# Altium footprint library PcbLib1.PcbLib: 45 footprints (part 3 of 3)
Each footprint in its own frame and in the unit in brackets; x right, y up, seen from the top. Pads: shape width x height; smd on the part's side, far side on the other; paste and mask are expansions set on the pad; w line width, h text height; cw(c..) or ccw(c..) is an arc to the next point about the centre after c.
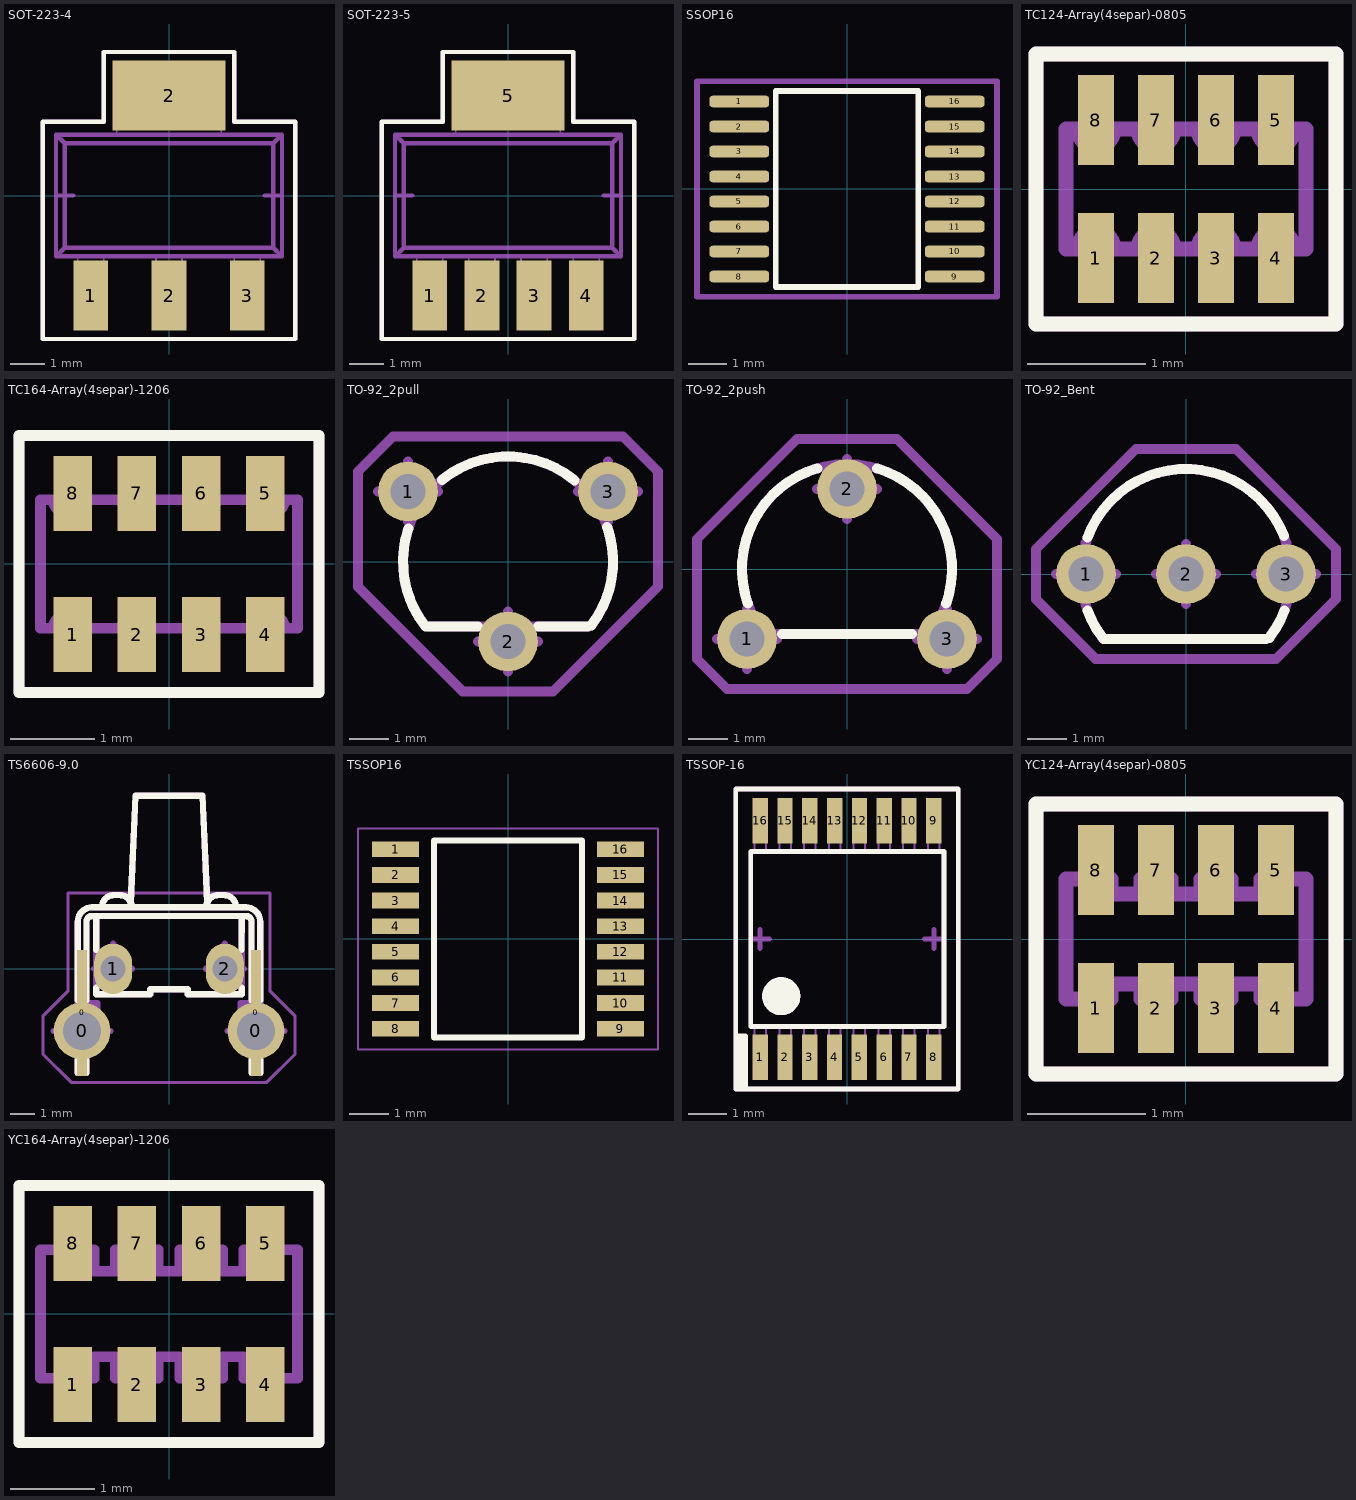
[diagram p2: the footprints below, top view; thin cyan lines are the x and y axes]

## SOT-223-4 [mil]
pads (4):
  rect 40x80 smd: 1(-90,-115) 2(0,-115) 3(90,-115)
  rect 130x80 smd: 2(0,115)
Top Overlay:
  lines w5: -145,-165 145,-165 145,85 75,85 75,165 -75,165 -75,85 -145,85 -145,-165
Bottom 3D Body:
  lines w2: -105,-105 -75,-105 ; -105,-90 -75,-90 ; -105,-70 -105,-140 -75,-140 -75,-70 ; -60,70 -60,140 60,140 60,70 ; -60,90 60,90 ; -60,105 60,105 ; -15,-105 15,-105 ; -15,-90 15,-90 ; -15,-70 -15,-140 15,-140 15,-70 ; 75,-105 105,-105 ; 75,-90 105,-90 ; 75,-70 75,-140 105,-140 105,-70
  lines w5: -130,-70 130,-70 ; -130,-70 -130,70 ; -130,-70 -120,-60 ; -130,70 130,70 ; -130,70 -120,60 ; -120,-60 -120,60 ; -120,-60 120,-60 ; -120,60 120,60 ; 120,-60 130,-70 ; 120,-60 120,60 ; 120,60 130,70 ; 130,-70 130,70
  text "'.Designator'" at -75,-15 h60
Mechanical 11:
  lines w5: -130,0 -110,0 ; -120,-10 -120,10 ; 110,0 130,0 ; 120,-10 120,10
Mechanical 15:
  lines w5: -145,-165 -145,85 -75,85 -75,165 75,165 75,85 145,85 145,-165 -145,-165
3D body "SOT-223-4.STEP": height 66.93, standoff -0.08, extent -129.92,-141.65 129.92,141.65

## SOT-223-5 [mil]
pads (5):
  rect 40x80 smd: 1(-90,-115) 2(-30,-115) 3(30,-115) 4(90,-115)
  rect 130x80 smd: 5(0,115)
Top Overlay:
  lines w5: -145,-165 145,-165 145,85 75,85 75,165 -75,165 -75,85 -145,85 -145,-165
Bottom 3D Body:
  lines w2: -105,-105 -75,-105 ; -105,-90 -75,-90 ; -105,-70 -105,-140 -75,-140 -75,-70 ; -60,70 -60,140 60,140 60,70 ; -60,90 60,90 ; -60,105 60,105 ; -45,-105 -15,-105 ; -45,-90 -15,-90 ; -45,-70 -45,-140 -15,-140 -15,-70 ; 15,-105 45,-105 ; 15,-90 45,-90 ; 15,-70 15,-140 45,-140 45,-70 ; 75,-105 105,-105 ; 75,-90 105,-90 ; 75,-70 75,-140 105,-140 105,-70
  lines w5: -130,-70 -120,-60 ; -130,-70 -130,70 ; -130,-70 130,-70 ; -130,70 -120,60 ; -130,70 130,70 ; -120,-60 120,-60 ; -120,-60 -120,60 ; -120,60 120,60 ; 120,-60 120,60 ; 120,-60 130,-70 ; 120,60 130,70 ; 130,-70 130,70
  text "'.Designator'" at -75,-15 h60
Mechanical 11:
  lines w5: -130,0 -110,0 ; -120,-10 -120,10 ; 110,0 130,0 ; 120,-10 120,10
Mechanical 15:
  lines w5: -145,-165 -145,85 -75,85 -75,165 75,165 75,85 145,85 145,-165 -145,-165
3D body "SOT-223-5.STEP": height 66.93, standoff 0, extent -129.92,-141.73 129.92,141.73

## SSOP16 [mm]
height 1.2
pads (16):
  rrect50% 1.55x0.3 smd: 1(-2.8,2.275) 2(-2.8,1.625) 3(-2.8,0.975) 4(-2.8,0.325) 5(-2.8,-0.325) 6(-2.8,-0.975) 7(-2.8,-1.625) 8(-2.8,-2.275) 9(2.8,-2.275) 10(2.8,-1.625) 11(2.8,-0.975) 12(2.8,-0.325) 13(2.8,0.325) 14(2.8,0.975) 15(2.8,1.625) 16(2.8,2.275)
Top Overlay:
  lines w0.15: -1.85,-2.55 1.85,-2.55 1.85,2.55 -1.85,2.55 -1.85,-2.55
  text "." at -2.6,2.9 h0.1
Top Courtyard:
  lines w0.15: -3.9,-2.8 3.9,-2.8 3.9,2.8 -3.9,2.8 -3.9,-2.8

## TC124-Array(4separ)-0805 [mil]
pads (8):
  rect 12x30 smd: 1(-30,-23) 2(-10,-23) 3(10,-23) 4(30,-23) 5(30,23) 6(10,23) 7(-10,23) 8(-30,23)
Top Overlay:
  lines w5: -50,-45 50,-45 50,45 -50,45 -50,-45
Bottom 3D Body:
  lines w5: -40,-20 -36,-20 cw(c-30,-20) -24,-20 -16,-20 cw(c-10,-20) -4,-20 4,-20 cw(c10,-20) 16,-20 24,-20 cw(c30,-20) 36,-20 40,-20 40,20 36,20 cw(c30,20) 24,20 16,20 cw(c10,20) 4,20 -4,20 cw(c-10,20) -16,20 -24,20 cw(c-30,20) -36,20 -40,20 -40,-20
  text "'.Designator'" at -40,-10 h30
Mechanical 15:
  lines w5: -50,-45 50,-45 50,45 -50,45 -50,-45
3D body "TC124-0805-4sep.STEP": height 15.79, standoff 0, extent -39.37,-19.68 39.37,19.69

## TC164-Array(4separ)-1206 [mil]
pads (8):
  rect 18x35 smd: 1(-45,-33) 2(-15,-33) 3(15,-33) 4(45,-33) 5(45,33) 6(15,33) 7(-15,33) 8(-45,33)
Top Overlay:
  lines w5: -70,-60 -70,60 70,60 70,-60 -70,-60
Bottom 3D Body:
  lines w5: -60,-30 -54,-30 cw(c-48,-30) -42,-30 -22,-30 cw(c-16,-30) -10,-30 10,-30 cw(c16,-30) 22,-30 42,-30 cw(c48,-30) 54,-30 60,-30 60,30 54,30 cw(c48,30) 42,30 22,30 cw(c16,30) 10,30 -10,30 cw(c-16,30) -22,30 -42,30 cw(c-48,30) -54,30 -60,30 -60,-30
  text "'.Designator'" at -60,-10 h40
Mechanical 15:
  lines w5: -70,-60 70,-60 70,60 -70,60 -70,-60
3D body "TC164-1206-4sep.STEP": height 23.66, standoff 0, extent -62.99,-31.49 63,31.5

## TO-92_2pull [mil]
pads (3):
  round 60 hole 35: 1(-100,70) 2(0,-80) 3(100,70)
Top Overlay:
  lines w10: -99.61,33.2 ccw(c0,0) -82.56,-64.87 ; -80,-65 -30,-65 ; -66.21,81.49 cw(c0,0) 66.55,81.22 ; 30,-65 80,-65 ; 83.41,-63.78 ccw(c0,0) 99.11,34.69
Bottom 3D Body:
  lines w10: -83.41,-63.78 cw(c0,0) 83.41,-63.78 ; -80,-65 80,-65
  text "'.Designator'" at -90,-15 h60
Mechanical 15:
  lines w10: -150,-25.31 -150,90 -115,125 115,125 150,90 150,-25 45,-130 -45.31,-130 -150,-25.31
Mechanical 25:
  lines w10: -130,70 -70,70 ; -100,40 -100,100 ; -30,-80 30,-80 ; 0,-110 0,-50 ; 70,70 130,70 ; 100,40 100,100
Mechanical 26:
  lines w10: -130,70 -70,70 ; -100,40 -100,100 ; -30,-80 30,-80 ; 0,-110 0,-50 ; 70,70 130,70 ; 100,40 100,100
3D body "TO-92_2pull.STEP": height 389.76, standoff -98.43, extent -110.04,-90.16 110.04,85.43

## TO-92_2push [mil]
pads (3):
  round 60 hole 35: 1(-100,-70) 2(0,80) 3(100,-70)
Top Overlay:
  lines w10: -99.1,-34.69 cw(c0,0) -29.63,100.74 ; -65,-65 65,-65 ; 30.17,100.57 cw(c0,0) 99.1,-34.69
Bottom 3D Body:
  lines w10: -83.41,-63.78 cw(c0,0) 83.41,-63.78 ; -80,-65 80,-65
  text "'.Designator'" at -90,-15 h60
Mechanical 15:
  lines w10: -150,-90 -150,30 -50,130 50,130 150,30 150,-90 120,-120 -120,-120 -150,-90
Mechanical 25:
  lines w10: -130,-70 -70,-70 ; -100,-100 -100,-40 ; -30,80 30,80 ; 0,50 0,110 ; 70,-70 130,-70 ; 100,-100 100,-40
Mechanical 26:
  lines w10: -130,-70 -70,-70 ; -100,-100 -100,-40 ; -30,80 30,80 ; 0,50 0,110 ; 70,-70 130,-70 ; 100,-100 100,-40
3D body "TO-92_2push.STEP": height 389.76, standoff -98.43, extent -110.04,-78.75 110.03,90.15

## TO-92_Bent [mil]
pads (3):
  round 60 hole 35: 1(-100,0) 2(0,0) 3(100,0)
Top Overlay:
  lines w10: -98.53,-36.3 ccw(c0,0) -82.56,-64.87 ; -98.53,36.3 cw(c0,0) 97.86,38.06 ; -80,-65 80,-65 ; 83.41,-63.78 ccw(c0,0) 98.53,-36.3
Bottom 3D Body:
  lines w10: -83.41,-63.78 cw(c0,0) 83.41,-63.78 ; -80,-65 80,-65
  text "'.Designator'" at -70,45 h60
Mechanical 15:
  lines w10: -150,-25.31 -150,25 -50,125 50,125 150,25 150,-25 90,-85 -90.31,-85 -150,-25.31
Mechanical 25:
  lines w10: -130,0 -70,0 ; -100,-30 -100,30 ; -30,0 30,0 ; 0,-30 0,30 ; 70,0 130,0 ; 100,-30 100,30
Mechanical 26:
  lines w10: -130,0 -70,0 ; -100,-30 -100,30 ; -30,0 30,0 ; 0,-30 0,30 ; 70,0 130,0 ; 100,-30 100,30
3D body "TO-92_Bent.STEP": height 389.76, standoff -98.43, extent -110.3,-69.3 110.03,85.43

## TS6606-9.0 [mil]
pads (6):
  round 90 hole 60: 0(-137.8,-98.43) 0(137.8,-98.43)
  rect 16x200 smd: 0(-137.8,-70) 0(137.8,-70)
  oval 60x80 hole 40: 1(-88.58,0) 2(88.58,0)
Top Overlay:
  lines w10: -144.69,-145 -144.69,-165 -130.91,-165 -130.91,-145 ; -144.69,-50 -144.69,74.8 cw(c-122.05,74.8) -122.05,97.44 122.05,97.44 cw(c122.05,74.8) 144.69,74.8 144.69,-50 ; -130.91,-50 -130.91,74.8 cw(c-122.05,74.8) -122.05,83.66 122.05,83.66 cw(c122.05,74.8) 130.91,74.8 130.91,-50 ; -115.16,-30 -115.16,-40.35 -29.53,-40.35 -29.53,-32.48 29.53,-32.48 29.53,-40.35 115.16,-40.35 115.16,-30 ; -115.16,30 -115.16,83.66 ; -106.3,97.44 cw(c-86.61,97.44) -86.61,117.13 -78.74,117.13 cw(c-78.74,97.44) -59.06,97.44 ; -60.49,104.82 -53.14,274.61 53.16,274.61 60.49,104.82 ; 59.06,97.44 cw(c78.74,97.44) 78.74,117.13 86.61,117.13 cw(c86.61,97.44) 106.3,97.44 ; 115,30 115.16,83.66 ; 130.91,-145 130.91,-165 144.69,-165 144.69,-145
Bottom 3D Body:
  lines w5: -162.41,-116.14 -162.41,-80.71 ; -145.77,-116.14 -166.39,-116.14 -166.39,-80.71 -144.69,-80.71 ; 144.69,-80.71 166.39,-80.71 166.39,-116.14 145.77,-116.14 ; 162.41,-116.14 162.41,-80.71 ; -101.38,-3.94 -101.38,3.94 -75.79,3.94 -75.79,-3.94 -101.38,-3.94 ; 75.79,-3.94 75.79,3.94 101.38,3.94 101.38,-3.94 75.79,-3.94
  lines w10: -144.69,-115.79 -130.91,-115.79 ; -144.69,-108.21 -130.91,-108.21 ; -130.91,-103.54 cw(c-113.98,-103.54) -122.44,-88.88 ccw(c-130.91,-74.22) -113.98,-74.22 -113.98,-54.13 -129.43,-54.13 ; -115.16,83.66 -115.16,-40.35 -29.53,-40.35 -29.53,-32.48 29.53,-32.48 29.53,-40.35 115.16,-40.35 115.16,83.66 ; -106.3,97.44 cw(c-86.61,97.44) -86.61,117.13 -78.74,117.13 cw(c-78.74,97.44) -59.06,97.44 ; -60.49,104.82 -53.14,274.61 53.16,274.61 60.49,104.82 ; 59.06,97.44 cw(c78.74,97.44) 78.74,117.13 86.61,117.13 cw(c86.61,97.44) 106.3,97.44 ; 129.43,-54.13 113.98,-54.13 113.98,-74.22 ccw(c130.91,-74.22) 122.44,-88.88 cw(c113.98,-103.54) 130.91,-103.54 ; 130.91,-115.79 144.69,-115.79 ; 130.91,-108.21 144.69,-108.21 ; -144.69,-165 -130.91,-165 -130.91,74.8 cw(c-122.05,74.8) -122.05,83.66 122.05,83.66 cw(c122.05,74.8) 130.91,74.8 130.91,-165 144.69,-165 144.69,74.8 ccw(c122.05,74.8) 122.05,97.44 -122.05,97.44 ccw(c-122.05,74.8) -144.69,74.8 -144.69,-165
  text "'.Designator'" at -86.61,-116.14 h60
Mechanical 15:
  lines w5: -200,-135 -200,-75 -160,-35 -160,120 160,120 160,-35 200,-75 200,-135 155,-180 -155,-180 -200,-135
Mechanical 25:
  lines w10: -182.8,-98.43 -92.8,-98.43 ; -137.8,-143.43 -137.8,-53.43 ; -118.58,0 -58.58,0 ; -88.58,-40 -88.58,40 ; 58.58,0 118.58,0 ; 88.58,-40 88.58,40 ; 92.8,-98.43 182.8,-98.43 ; 137.8,-143.43 137.8,-53.43
Mechanical 26:
  lines w10: -182.8,-98.43 -92.8,-98.43 ; -137.8,-143.43 -137.8,-53.43 ; -118.58,0 -58.58,0 ; -88.58,-40 -88.58,40 ; 58.58,0 118.58,0 ; 88.58,-40 88.58,40 ; 92.8,-98.43 182.8,-98.43 ; 137.8,-143.43 137.8,-53.43
3D body "KLS7-TS6606-8.0.STEP": height 279.53, standoff -153.54, extent -166.27,-164.36 166.28,277.56

## TSSOP16 [mm] "TSOP, 16-Leads, Body 5,00x4,40mm, Pitch 0,65mm, IPC High Density"
height 1.2
pads (16):
  rect 1.2x0.4 smd: 1(-2.85,2.275) 2(-2.85,1.625) 3(-2.85,0.975) 4(-2.85,0.325) 5(-2.85,-0.325) 6(-2.85,-0.975) 7(-2.85,-1.625) 8(-2.85,-2.275) 9(2.85,-2.275) 10(2.85,-1.625) 11(2.85,-0.975) 12(2.85,-0.325) 13(2.85,0.325) 14(2.85,0.975) 15(2.85,1.625) 16(2.85,2.275)
Top Overlay:
  lines w0.15: -1.875,-2.5 -1.875,2.5 1.875,2.5 1.875,-2.5 -1.875,-2.5
  text "." at -2.9,3 h0.1
Top Courtyard:
  lines w0.05: -3.8,-2.8 -3.8,2.8 3.8,2.8 3.8,-2.8 -3.8,-2.8
3D body "TSSOP16.step": height 1.2, standoff 0, extent -3.2,-2.5 3.2,2.5

## TSSOP-16 [mm]
pads (16):
  rect 0.4x1.2 smd: 1(-2.275,-3.1) 2(-1.625,-3.1) 3(-0.975,-3.1) 4(-0.325,-3.1) 5(0.325,-3.1) 6(0.975,-3.1) 7(1.625,-3.1) 8(2.275,-3.1) 9(2.275,3.1) 10(1.625,3.1) 11(0.975,3.1) 12(0.325,3.1) 13(-0.325,3.1) 14(-0.975,3.1) 15(-1.625,3.1) 16(-2.275,3.1)
Top Overlay:
  circle w0.5: c-1.725,-1.5 r0.25
  lines w0.127: -2.905,-2.55 -2.668,-2.55 -2.668,-3.937 ; -2.795,-3.937 -2.795,-2.55 ; -2.921,-3.937 2.921,-3.937 2.921,3.937 -2.921,3.937 -2.921,-3.937 ; -2.525,-2.3 -2.525,2.3 2.55,2.3 2.55,-2.3 -2.525,-2.3
Bottom 3D Body:
  circle w0.5: c-1.725,-1.5 r0.25
  lines w0.051: -2.425,2.3 -2.425,3.3 -2.125,3.3 -2.125,2.3 ; -2.425,2.55 -2.125,2.55 ; -2.425,2.725 -2.125,2.725 ; -2.425,-2.725 -2.125,-2.725 ; -2.425,-2.55 -2.125,-2.55 ; -2.425,-2.3 -2.425,-3.3 -2.125,-3.3 -2.125,-2.3 ; -1.775,2.3 -1.775,3.3 -1.475,3.3 -1.475,2.3 ; -1.775,2.55 -1.475,2.55 ; -1.775,2.725 -1.475,2.725 ; -1.775,-2.725 -1.475,-2.725 ; -1.775,-2.55 -1.475,-2.55 ; -1.775,-2.3 -1.775,-3.3 -1.475,-3.3 -1.475,-2.3 ; -1.125,-2.725 -0.825,-2.725 ; -1.125,-2.55 -0.825,-2.55 ; -1.125,-2.3 -1.125,-3.3 -0.825,-3.3 -0.825,-2.3 ; -1.125,2.3 -1.125,3.3 -0.825,3.3 -0.825,2.3 ; -1.125,2.55 -0.825,2.55 ; -1.125,2.725 -0.825,2.725 ; -0.475,-2.725 -0.175,-2.725 ; -0.475,-2.55 -0.175,-2.55 ; -0.475,-2.3 -0.475,-3.3 -0.175,-3.3 -0.175,-2.3 ; -0.475,2.3 -0.475,3.3 -0.175,3.3 -0.175,2.3 ; -0.475,2.55 -0.175,2.55 ; -0.475,2.725 -0.175,2.725 ; 0.175,-2.725 0.475,-2.725 ; 0.175,-2.55 0.475,-2.55 ; 0.175,-2.3 0.175,-3.3 0.475,-3.3 0.475,-2.3 ; 0.175,2.3 0.175,3.3 0.475,3.3 0.475,2.3 ; 0.175,2.55 0.475,2.55 ; 0.175,2.725 0.475,2.725 ; 0.825,2.3 0.825,3.3 1.125,3.3 1.125,2.3 ; 0.825,2.55 1.125,2.55 ; 0.825,2.725 1.125,2.725 ; 0.825,-2.725 1.125,-2.725 ; 0.825,-2.55 1.125,-2.55 ; 0.825,-2.3 0.825,-3.3 1.125,-3.3 1.125,-2.3 ; 1.475,2.3 1.475,3.3 1.775,3.3 1.775,2.3 ; 1.475,2.55 1.775,2.55 ; 1.475,2.725 1.775,2.725 ; 1.475,-2.725 1.775,-2.725 ; 1.475,-2.55 1.775,-2.55 ; 1.475,-2.3 1.475,-3.3 1.775,-3.3 1.775,-2.3 ; 2.125,2.3 2.125,3.3 2.425,3.3 2.425,2.3 ; 2.125,2.55 2.425,2.55 ; 2.125,2.725 2.425,2.725 ; 2.125,-2.725 2.425,-2.725 ; 2.125,-2.55 2.425,-2.55 ; 2.125,-2.3 2.125,-3.3 2.425,-3.3 2.425,-2.3
  lines w0.127: -2.525,-2.3 -2.525,2.3 2.55,2.3 2.55,-2.3 -2.525,-2.3
  text "'.Designator'" at -2.2,-0.3 h1.02
  text "TSSOP-16" at -0.8,1.525 h0.51
Mechanical 11:
  lines w0.127: -2.54,0 -2.032,0 ; -2.286,-0.254 -2.286,0.254 ; 2.032,0 2.54,0 ; 2.286,-0.254 2.286,0.254
Mechanical 15:
  lines w0.127: -2.921,-3.937 -2.921,3.937 2.921,3.937 2.921,-3.937 -2.921,-3.937
3D body "TSSOP-16.STEP": height 1.2, standoff 0, extent -2.55,-3.2 2.55,3.2

## YC124-Array(4separ)-0805 [mil]
pads (8):
  rect 12x30 smd: 1(-30,-23) 2(-10,-23) 3(10,-23) 4(30,-23) 5(30,23) 6(10,23) 7(-10,23) 8(-30,23)
Top Overlay:
  lines w5: -50,-45 -50,45 50,45 50,-45 -50,-45
Bottom 3D Body:
  lines w5: -40,-20 -25,-20 -25,-15 -15,-15 -15,-20 -5,-20 -5,-15 5,-15 5,-20 15,-20 15,-15 25,-15 25,-20 40,-20 40,20 25,20 25,15 15,15 15,20 5,20 5,15 -5,15 -5,20 -15,20 -15,15 -25,15 -25,20 -40,20 -40,-20
  text "'.Designator'" at -40,-10 h30
Mechanical 15:
  lines w5: -50,-45 -50,45 50,45 50,-45 -50,-45
3D body "YC124-0805-4sep.STEP": height 15.39, standoff 0, extent -39.37,-19.68 39.37,19.69

## YC164-Array(4separ)-1206 [mil]
pads (8):
  rect 18x35 smd: 1(-45,-33) 2(-15,-33) 3(15,-33) 4(45,-33) 5(45,33) 6(15,33) 7(-15,33) 8(-45,33)
Top Overlay:
  lines w5: -70,-60 70,-60 70,60 -70,60 -70,-60
Bottom 3D Body:
  lines w5: -60,-30 -35,-30 -35,-20 -25,-20 -25,-30 -5,-30 -5,-20 5,-20 5,-30 25,-30 25,-20 35,-20 35,-30 60,-30 60,30 35,30 35,20 25,20 25,30 5,30 5,20 -5,20 -5,30 -25,30 -25,20 -35,20 -35,30 -60,30 -60,-30
  text "'.Designator'" at -60,-10 h40
Mechanical 15:
  lines w5: -70,-60 -70,60 70,60 70,-60 -70,-60
3D body "YC164-1206-4sep.STEP": height 22.87, standoff 0, extent -62.99,-31.49 63,31.5